# Altium footprint library ICs And Semiconductors SMD.PcbLib: 602 footprints (part 22 of 38)
Each footprint in its own frame and in the unit in brackets; x right, y up, seen from the top. Pads: shape width x height; smd on the part's side, far side on the other; paste and mask are expansions set on the pad; w line width, h text height; cw(c..) or ccw(c..) is an arc to the next point about the centre after c.
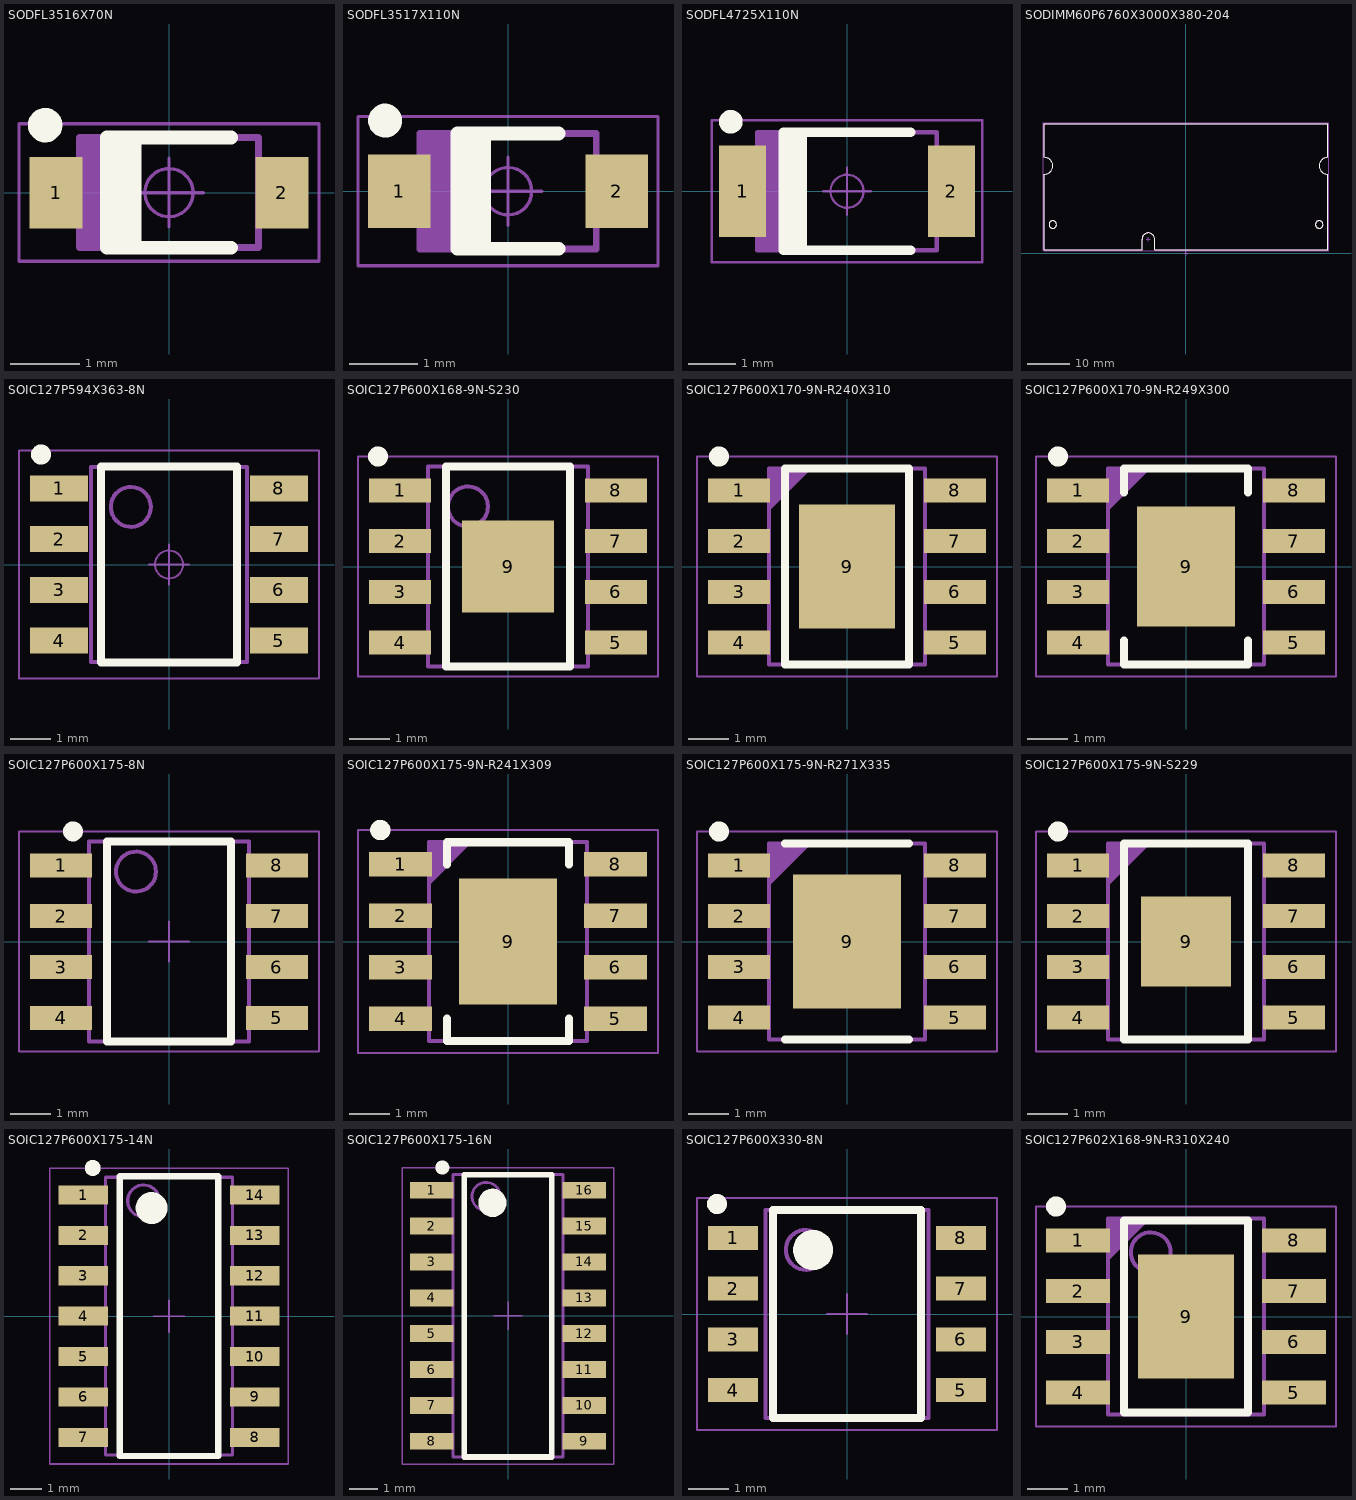
[diagram p21: the footprints below, top view; thin cyan lines are the x and y axes]

## SODFL3516X70N [mm] "SODFL Diode; 2.60mm W X 1.60mm L X 0.70mm H Body, IPC Medium Density"
height 0.7
pads (2):
  rect 0.77x1.04 smd: 1(-1.64,0) 2(1.64,0)
Top Overlay:
  circle w0.25: c-1.8,0.98 r0.125
  lines w0.2: -0.7,-0.8 -0.7,0.8 ; -0.5,-0.8 -0.5,0.8 ; 0.9,-0.8 -0.9,-0.8 -0.9,0.8 0.9,0.8
Mechanical 14:
  lines w0.1: -1.2,-0.8 -1.2,0.8 ; -1.1,-0.8 -1.1,0.8 ; -1,-0.8 -1,0.8 ; -0.9,-0.8 -0.9,0.8 ; -0.8,-0.8 -0.8,0.8 ; -0.7,-0.8 -0.7,0.8 ; -0.6,-0.8 -0.6,0.8 ; -0.5,-0.8 -0.5,0.8 ; -1.3,-0.8 1.3,-0.8 1.3,0.8 -1.3,0.8 -1.3,-0.8
Mechanical 15:
  circle w0.05: c0,0 r0.35
  lines w0.05: -0.5,0 0.5,0 ; 0,-0.5 0,0.5 ; -2.18,-1 2.18,-1 2.18,1 -2.18,1 -2.18,-1
3D body "SODFL3516X70N.stp": height 0.7, standoff 0, extent -1.7,-0.8 1.7,0.8

## SODFL3517X110N [mm] "SODFL Diode (SOD123W); 2.60mm W X 1.70mm L X 1.10mm H body, IPC Medium Density"
height 1.1
pads (2):
  rect 0.92x1.08 smd: 1(-1.6,0) 2(1.6,0)
Top Overlay:
  circle w0.25: c-1.81,1.04 r0.125
  lines w0.2: -0.55,-0.85 -0.55,0.85 ; -0.35,-0.85 -0.35,0.85 ; 0.75,-0.85 -0.75,-0.85 -0.75,0.85 0.75,0.85
Mechanical 14:
  lines w0.1: -1.2,-0.85 -1.2,0.85 ; -1.1,-0.85 -1.1,0.85 ; -1,-0.85 -1,0.85 ; -0.9,-0.85 -0.9,0.85 ; -0.8,-0.85 -0.8,0.85 ; -0.7,-0.85 -0.7,0.85 ; -0.6,-0.85 -0.6,0.85 ; -0.5,-0.85 -0.5,0.85 ; -1.3,-0.85 1.3,-0.85 1.3,0.85 -1.3,0.85 -1.3,-0.85
Mechanical 15:
  circle w0.05: c0,0 r0.35
  lines w0.05: -0.5,0 0.5,0 ; 0,-0.5 0,0.5 ; -2.21,-1.1 2.21,-1.1 2.21,1.1 -2.21,1.1 -2.21,-1.1
3D body "SODFL3517X110N.stp": height 1.1, standoff 0, extent -1.85,-0.95 1.85,0.95

## SODFL4725X110N [mm] "SOD128, SODFL Diode; 3.80mm W X 2.50mm L X 1.10mm H Body, IPC Medium Density"
height 1.1
pads (2):
  rect 1x1.93 smd: 1(-2.21,0) 2(2.21,0)
Top Overlay:
  circle w0.25: c-2.46,1.47 r0.125
  lines w0.2: -1.15,-1.25 -1.15,1.25 ; -0.95,-1.25 -0.95,1.25 ; 1.35,-1.25 -1.35,-1.25 -1.35,1.25 1.35,1.25
Mechanical 14:
  lines w0.1: -1.8,-1.25 -1.8,1.25 ; -1.7,-1.25 -1.7,1.25 ; -1.6,-1.25 -1.6,1.25 ; -1.5,-1.25 -1.5,1.25 ; -1.4,-1.25 -1.4,1.25 ; -1.3,-1.25 -1.3,1.25 ; -1.2,-1.25 -1.2,1.25 ; -1.1,-1.25 -1.1,1.25 ; -1.9,-1.25 -1.9,1.25 1.9,1.25 1.9,-1.25 -1.9,-1.25
Mechanical 15:
  circle w0.05: c0,0 r0.35
  lines w0.05: -0.5,0 0.5,0 ; 0,-0.5 0,0.5 ; -2.86,-1.5 -2.86,1.5 2.86,1.5 2.86,-1.5 -2.86,-1.5
3D body "SODFL4725X110N.stp": height 1.1, standoff 0, extent -2.5,-1.35 2.5,1.35

## SODIMM60P6760X3000X380-204 [mm] "SODIMM DDR3 204-Pin SDRAM Module, Body; 67.6mm L X 30mm W X 3.8mm H"
height 3.8
Top Overlay:
  circle w0.2: c31.8,6.8 r0.9
  circle w0.2: c-31.8,6.8 r0.9
  lines w0.2: -33.8,0.8 -33.8,18.8 ccw(c-33.8,20.8) -33.8,22.8 -33.8,30.8 33.8,30.8 33.8,22.8 ccw(c33.8,20.8) 33.8,18.8 33.8,0.8 -7.5,0.8 -7.5,3.3 ccw(c-9,3.3) -10.5,3.3 -10.5,0.8 -33.8,0.8
Mechanical 8:
  lines w0.1: -9.5,3.3 -9,3.3 ; -9,2.8 -9,3.3 ; -9,3.8 -9,3.3 ; -8.5,3.3 -9,3.3 ; -0.5,0 0,0 ; 0,-0.5 0,0 ; 0,0.5 0,0 ; 0.5,0 0,0
Mechanical 14:
  circle w0.1: c31.8,6.8 r0.9
  circle w0.1: c-31.8,6.8 r0.9
  lines w0.1: -33.8,0.8 -10.5,0.8 -10.5,3.3 cw(c-9,3.3) -7.5,3.3 -7.5,0.8 33.8,0.8 33.8,18.8 cw(c33.8,20.8) 33.8,22.8 33.8,30.8 -33.8,30.8 -33.8,22.8 cw(c-33.8,20.8) -33.8,18.8 -33.8,0.8
Mechanical 15:
  lines w0.05: -34.05,0.55 34.05,0.55 34.05,31.05 -34.05,31.05 -34.05,0.55
3D body "SODIMM60P6760X3000X380-204.stp": height 3.8, standoff 0, extent -33.8,0.8 33.8,30.8

## SOIC127P594X363-8N [mm] "SOIC, 1.27mm pitch; 8  pin, 3.91mm W X 4.88mm L, IPC Medium Density"
height 3.63
pads (8):
  rect 1.45x0.65 smd: 1(-2.75,1.905) 2(-2.75,0.635) 3(-2.75,-0.635) 4(-2.75,-1.905) 5(2.75,-1.905) 6(2.75,-0.635) 7(2.75,0.635) 8(2.75,1.905)
Top Overlay:
  circle w0.25: c-3.2,2.75 r0.125
  lines w0.2: -1.7,-2.45 -1.7,2.45 1.7,2.45 1.7,-2.45 -1.7,-2.45
Mechanical 14:
  circle w0.1: c-0.955,1.44 r0.5
  lines w0.1: -1.955,-2.44 -1.955,2.44 1.955,2.44 1.955,-2.44 -1.955,-2.44
Mechanical 15:
  circle w0.05: c0,0 r0.35
  lines w0.05: -0.5,0 0.5,0 ; 0,-0.5 0,0.5 ; -3.75,-2.85 -3.75,2.85 3.75,2.85 3.75,-2.85 -3.75,-2.85
3D body "SOIC127P594X363-8N.stp": height 3.63, standoff 0, extent -3.1,-2.5 3.1,2.5

## SOIC127P600X168-9N-S230 [mm] "SOIC, 1.27mm pitch; 8 pin, 4.00mm W X 5.00mm L X 1.68mm H body (w/thermal tab), IPC Medium Density"
height 1.68
pads (9):
  rect 1.55x0.6 smd: 1(-2.7,1.905) 2(-2.7,0.635) 3(-2.7,-0.635) 4(-2.7,-1.905) 5(2.7,-1.905) 6(2.7,-0.635) 7(2.7,0.635) 8(2.7,1.905)
  rect 2.3x2.3 smd: 9(0,0)
Top Overlay:
  circle w0.25: c-3.25,2.75 r0.125
  lines w0.2: -1.55,-2.5 1.55,-2.5 1.55,2.5 -1.55,2.5 -1.55,-2.5
Top Paste:
  region: -0.69,0.69 0.69,0.69 0.69,-0.69 -0.69,-0.69
Mechanical 14:
  circle w0.1: c-1,1.5 r0.5
  lines w0.1: -2,-2.5 2,-2.5 2,2.5 -2,2.5 -2,-2.5
Mechanical 15:
  lines w0.05: -0.5,0 0.5,0 ; 0,-0.5 0,0.5 ; -3.75,-2.75 3.75,-2.75 3.75,2.75 -3.75,2.75 -3.75,-2.75
3D body "SOIC127P600X168-9N-S230.stp": height 1.68, standoff 0, extent -3.1,-2.5 3.1,2.5

## SOIC127P600X170-9N-R240X310 [mm] "SOIC 8, Pitch 1.27mm - Body 4x5mm, (w/Thermal Tab 2.4mm X 3.1mm), IPC Medium Density"
height 1.7
pads (9):
  rect 1.55x0.6 smd: 1(-2.7,1.905) 2(-2.7,0.635) 3(-2.7,-0.635) 4(-2.7,-1.905) 5(2.7,-1.905) 6(2.7,-0.635) 7(2.7,0.635) 8(2.7,1.905)
  rect 2.4x3.1 smd: 9(0,0)
Top Overlay:
  circle w0.25: c-3.2,2.75 r0.125
  lines w0.2: -1.55,-2.45 -1.55,2.45 1.55,2.45 1.55,-2.45 -1.55,-2.45
Mechanical 14:
  lines w0.1: -1.95,1.45 -0.95,2.45 ; -1.95,1.55 -1.05,2.45 ; -1.95,1.65 -1.15,2.45 ; -1.95,1.75 -1.25,2.45 ; -1.95,1.85 -1.35,2.45 ; -1.95,1.95 -1.45,2.45 ; -1.95,2.05 -1.55,2.45 ; -1.95,2.15 -1.65,2.45 ; -1.95,2.25 -1.75,2.45 ; -1.95,2.35 -1.85,2.45 ; -1.95,-2.45 -1.95,2.45 1.95,2.45 1.95,-2.45 -1.95,-2.45
Mechanical 15:
  circle w0.05: c0,0 r0.35
  lines w0.05: -0.5,0 0.5,0 ; 0,-0.5 0,0.5 ; -3.75,-2.75 -3.75,2.75 3.75,2.75 3.75,-2.75 -3.75,-2.75
3D body "SOIC127P600X170-9N-R240X310.stp": height 1.75, standoff 0, extent -3.1,-2.5 3.1,2.5

## SOIC127P600X170-9N-R249X300 [mm] "SOIC 8, Pitch 1.27mm - Body 4x5mm, (w/thermal tab 2.49mm X 3mm), IPC Medium Density"
height 1.7
pads (9):
  rect 1.55x0.6 smd: 1(-2.7,1.905) 2(-2.7,0.635) 3(-2.7,-0.635) 4(-2.7,-1.905) 5(2.7,-1.905) 6(2.7,-0.635) 7(2.7,0.635) 8(2.7,1.905)
  rect 2.45x3 smd: 9(0,0)
Top Overlay:
  circle w0.25: c-3.2,2.75 r0.125
  lines w0.2: -1.55,-1.85 -1.55,-2.45 1.55,-2.45 1.55,-1.85 ; -1.55,1.85 -1.55,2.45 1.55,2.45 1.55,1.85
Mechanical 14:
  lines w0.1: -1.95,1.45 -0.95,2.45 ; -1.95,1.55 -1.05,2.45 ; -1.95,1.65 -1.15,2.45 ; -1.95,1.75 -1.25,2.45 ; -1.95,1.85 -1.35,2.45 ; -1.95,1.95 -1.45,2.45 ; -1.95,2.05 -1.55,2.45 ; -1.95,2.15 -1.65,2.45 ; -1.95,2.25 -1.75,2.45 ; -1.95,2.35 -1.85,2.45 ; -1.95,-2.45 1.95,-2.45 1.95,2.45 -1.95,2.45 -1.95,-2.45
Mechanical 15:
  circle w0.05: c0,0 r0.35
  lines w0.05: -0.5,0 0.5,0 ; 0,-0.5 0,0.5 ; -3.75,-2.75 3.75,-2.75 3.75,2.75 -3.75,2.75 -3.75,-2.75
3D body "SOIC127P600X170-9N-R249X300.stp": height 1.75, standoff 0, extent -3.1,-2.5 3.1,2.5

## SOIC127P600X175-8N [mm] "SOIC 8, Pitch 1.27mm - Body 4x5mm, IPC Medium Density"
height 1.75
pads (8):
  rect 1.55x0.6 smd: 1(-2.7,1.905) 2(-2.7,0.635) 3(-2.7,-0.635) 4(-2.7,-1.905) 5(2.7,-1.905) 6(2.7,-0.635) 7(2.7,0.635) 8(2.7,1.905)
Top Overlay:
  circle w0.25: c-2.4,2.755 r0.125
  lines w0.2: -1.55,-2.5 1.55,-2.5 1.55,2.5 -1.55,2.5 -1.55,-2.5
Mechanical 14:
  circle w0.1: c-0.825,1.75 r0.5
  lines w0.1: -2,-2.5 2,-2.5 2,2.5 -2,2.5 -2,-2.5
Mechanical 15:
  lines w0.05: -0.5,0 0.5,0 ; 0,-0.5 0,0.5 ; -3.75,-2.75 3.75,-2.75 3.75,2.75 -3.75,2.75 -3.75,-2.75
3D body "SOIC127P600X175-8N.stp": height 1.75, standoff 0, extent -3.1,-2.5 3.1,2.5

## SOIC127P600X175-9N-R241X309 [mm] "SOIC 8, Pitch 1.27mm - Body 3.9x4.9mm, (w/thermal tab 2.41mm X 3.098mm), IPC Medium Density"
height 1.75
pads (9):
  rect 1.55x0.6 smd: 1(-2.65,1.905) 2(-2.65,0.635) 3(-2.65,-0.635) 4(-2.65,-1.905) 5(2.65,-1.905) 6(2.65,-0.635) 7(2.65,0.635) 8(2.65,1.905)
  rect 2.41x3.098 smd: 9(0,0)
Top Overlay:
  circle w0.25: c-3.15,2.75 r0.125
  lines w0.2: -1.5,-1.9 -1.5,-2.45 1.5,-2.45 1.5,-1.9 ; -1.5,1.9 -1.5,2.45 1.5,2.45 1.5,1.9
Mechanical 14:
  lines w0.1: -1.95,1.45 -0.95,2.45 ; -1.95,1.55 -1.05,2.45 ; -1.95,1.65 -1.15,2.45 ; -1.95,1.75 -1.25,2.45 ; -1.95,1.85 -1.35,2.45 ; -1.95,1.95 -1.45,2.45 ; -1.95,2.05 -1.55,2.45 ; -1.95,2.15 -1.65,2.45 ; -1.95,2.25 -1.75,2.45 ; -1.95,2.35 -1.85,2.45 ; -1.95,-2.45 1.95,-2.45 1.95,2.45 -1.95,2.45 -1.95,-2.45
Mechanical 15:
  circle w0.05: c0,0 r0.35
  lines w0.05: -0.5,0 0.5,0 ; 0,-0.5 0,0.5 ; -3.7,-2.75 3.7,-2.75 3.7,2.75 -3.7,2.75 -3.7,-2.75
3D body "SOIC127P600X175-9N-R241X309.stp": height 1.75, standoff 0, extent -3.1,-2.5 3.1,2.5

## SOIC127P600X175-9N-R271X335 [mm] "SOIC, 1.27mm Pitch; 8 Pin, 3.90mm W X 4.90mm L X 1.75mm H body, (w/thermal tab 2.71mm X 3.35mm), IPC Medium Density"
height 1.75
pads (9):
  rect 1.55x0.6 smd: 1(-2.7,1.905) 2(-2.7,0.635) 3(-2.7,-0.635) 4(-2.7,-1.905) 5(2.7,-1.905) 6(2.7,-0.635) 7(2.7,0.635) 8(2.7,1.905)
  rect 2.7x3.35 smd: 9(0,0)
Top Overlay:
  circle w0.25: c-3.2,2.75 r0.125
  lines w0.2: -1.55,-2.45 1.55,-2.45 ; -1.55,2.45 1.55,2.45
Mechanical 14:
  lines w0.1: -1.95,1.45 -0.95,2.45 ; -1.95,1.55 -1.05,2.45 ; -1.95,1.65 -1.15,2.45 ; -1.95,1.75 -1.25,2.45 ; -1.95,1.85 -1.35,2.45 ; -1.95,1.95 -1.45,2.45 ; -1.95,2.05 -1.55,2.45 ; -1.95,2.15 -1.65,2.45 ; -1.95,2.25 -1.75,2.45 ; -1.95,2.35 -1.85,2.45 ; -1.95,-2.45 -1.95,2.45 1.95,2.45 1.95,-2.45 -1.95,-2.45
Mechanical 15:
  circle w0.05: c0,0 r0.35
  lines w0.05: -0.5,0 0.5,0 ; 0,-0.5 0,0.5 ; -3.75,-2.75 -3.75,2.75 3.75,2.75 3.75,-2.75 -3.75,-2.75
3D body "SOIC127P600X175-9N-R271X335.stp": height 1.75, standoff 0, extent -3.1,-2.5 3.1,2.5

## SOIC127P600X175-9N-S229 [mm] "SOIC 8, Pitch 1.27mm - Body 4x5mm, (w/thermal tab 2.29mm X 2.29mm), IPC Medium Density"
height 1.75
pads (9):
  rect 1.55x0.6 smd: 1(-2.7,1.905) 2(-2.7,0.635) 3(-2.7,-0.635) 4(-2.7,-1.905) 5(2.7,-1.905) 6(2.7,-0.635) 7(2.7,0.635) 8(2.7,1.905)
  rect 2.25x2.25 smd: 9(0,0)
Top Overlay:
  circle w0.25: c-3.2,2.75 r0.125
  lines w0.2: -1.55,-2.45 1.55,-2.45 1.55,2.45 -1.55,2.45 -1.55,-2.45
Mechanical 14:
  lines w0.1: -1.95,1.45 -0.95,2.45 ; -1.95,1.55 -1.05,2.45 ; -1.95,1.65 -1.15,2.45 ; -1.95,1.75 -1.25,2.45 ; -1.95,1.85 -1.35,2.45 ; -1.95,1.95 -1.45,2.45 ; -1.95,2.05 -1.55,2.45 ; -1.95,2.15 -1.65,2.45 ; -1.95,2.25 -1.75,2.45 ; -1.95,2.35 -1.85,2.45 ; -1.95,-2.45 1.95,-2.45 1.95,2.45 -1.95,2.45 -1.95,-2.45
Mechanical 15:
  lines w0.05: -0.5,0 0.5,0 ; 0,-0.5 0,0.5 ; -3.75,-2.75 3.75,-2.75 3.75,2.75 -3.75,2.75 -3.75,-2.75
3D body "SOIC127P600X175-9N-S229.stp": height 1.75, standoff 0, extent -3.1,-2.5 3.1,2.5

## SOIC127P600X175-14N [mm] "SOIC 14, Pitch 1.27mm - Body 4x8.75mm, IPC Medium Density"
height 1.75
pads (14):
  rect 1.55x0.6 smd: 1(-2.7,3.81) 2(-2.7,2.54) 3(-2.7,1.27) 4(-2.7,0) 5(-2.7,-1.27) 6(-2.7,-2.54) 7(-2.7,-3.81) 8(2.7,-3.81) 9(2.7,-2.54) 10(2.7,-1.27) 11(2.7,0) 12(2.7,1.27) 13(2.7,2.54) 14(2.7,3.81)
Top Overlay:
  circle w0.25: c-2.4,4.66 r0.125
  circle w0.5: c-0.55,3.4 r0.25
  lines w0.2: -1.55,-4.4 1.55,-4.4 1.55,4.4 -1.55,4.4 -1.55,-4.4
Mechanical 14:
  circle w0.1: c-0.8,3.625 r0.5
  lines w0.1: -2,-4.37 2,-4.37 2,4.37 -2,4.37 -2,-4.37
Mechanical 15:
  lines w0.05: -0.5,0 0.5,0 ; 0,-0.5 0,0.5 ; -3.75,-4.65 3.75,-4.65 3.75,4.65 -3.75,4.65 -3.75,-4.65
3D body "SOIC127P600X175-14N.stp": height 1.75, standoff 0, extent -3.1,-4.375 3.1,4.375

## SOIC127P600X175-16N [mm] "SOIC 16, Pitch 1.27mm - Body 4x10mm, IPC Medium Density"
height 1.75
pads (16):
  rect 1.55x0.6 smd: 1(-2.7,4.445) 2(-2.7,3.175) 3(-2.7,1.905) 4(-2.7,0.635) 5(-2.7,-0.635) 6(-2.7,-1.905) 7(-2.7,-3.175) 8(-2.7,-4.445) 9(2.7,-4.445) 10(2.7,-3.175) 11(2.7,-1.905) 12(2.7,-0.635) 13(2.7,0.635) 14(2.7,1.905) 15(2.7,3.175) 16(2.7,4.445)
Top Overlay:
  circle w0.25: c-2.325,5.25 r0.125
  circle w0.5: c-0.55,4 r0.25
  lines w0.2: -1.55,-5 -1.55,5 1.55,5 1.55,-5 -1.55,-5
Mechanical 14:
  circle w0.1: c-0.775,4.225 r0.5
  lines w0.1: -1.95,-5 1.95,-5 1.95,5 -1.95,5 -1.95,-5
Mechanical 15:
  lines w0.05: -0.5,0 0.5,0 ; 0,-0.5 0,0.5 ; -3.75,-5.25 -3.75,5.25 3.75,5.25 3.75,-5.25 -3.75,-5.25
3D body "SOIC127P600X175-16N.stp": height 1.75, standoff 0, extent -3.1,-5 3.1,5

## SOIC127P600X330-8N [mm] "SOIC, 1.27mm pitch;8  pin, 4.00mm W X 5.00mm L, IPC Medium Density"
height 3.3
pads (8):
  rect 1.25x0.6 smd: 1(-2.85,1.905) 2(-2.85,0.635) 3(-2.85,-0.635) 4(-2.85,-1.905) 5(2.85,-1.905) 6(2.85,-0.635) 7(2.85,0.635) 8(2.85,1.905)
Top Overlay:
  circle w0.5: c-0.85,1.6 r0.25
  circle w0.25: c-3.25,2.75 r0.125
  lines w0.2: -1.85,-2.6 1.85,-2.6 1.85,2.6 -1.85,2.6 -1.85,-2.6
Mechanical 14:
  circle w0.1: c-1.032,1.604 r0.5
  lines w0.1: -2.032,-2.604 2.032,-2.604 2.032,2.604 -2.032,2.604 -2.032,-2.604
Mechanical 15:
  lines w0.05: -0.5,0 0.5,0 ; 0,-0.5 0,0.5 ; -3.75,-2.9 3.75,-2.9 3.75,2.9 -3.75,2.9 -3.75,-2.9
3D body "SOIC127P600X330-8N.stp": height 3.3, standoff 0, extent -3,-2.6 3,2.6

## SOIC127P602X168-9N-R310X240 [mm] "SOIC,1.27mm,pitch;8 pin,3.905mm W X 4.895mm L X 1.68mm H body (w/thermal tab 3.1mm X 2.4mm), IPC Medium Density"
height 1.68
pads (9):
  rect 1.6x0.6 smd: 1(-2.7,1.905) 2(-2.7,0.635) 3(-2.7,-0.635) 4(-2.7,-1.905) 5(2.7,-1.905) 6(2.7,-0.635) 7(2.7,0.635) 8(2.7,1.905)
  rect 2.4x3.1 smd: 9(0,0)
Top Overlay:
  circle w0.25: c-3.25,2.75 r0.125
  lines w0.2: -1.55,-2.4 1.55,-2.4 1.55,2.4 -1.55,2.4 -1.55,-2.4
Mechanical 14:
  circle w0.1: c-0.882,1.604 r0.5
  lines w0.1: -1.953,1.447 -0.952,2.448 ; -1.953,1.547 -1.052,2.448 ; -1.953,1.647 -1.152,2.448 ; -1.953,1.847 -1.352,2.448 ; -1.953,2.047 -1.552,2.448 ; -1.953,2.148 -1.652,2.448 ; -1.953,2.347 -1.852,2.448 ; -1.952,1.747 -1.252,2.448 ; -1.952,1.947 -1.452,2.448 ; -1.952,2.247 -1.752,2.448 ; -1.952,-2.448 1.952,-2.448 1.952,2.448 -1.952,2.448 -1.952,-2.448
Mechanical 15:
  lines w0.05: -0.5,0 0.5,0 ; 0,-0.5 0,0.5 ; -3.75,-2.75 3.75,-2.75 3.75,2.75 -3.75,2.75 -3.75,-2.75
3D body "SOIC127P602X168-9N-R310X240.stp": height 1.68, standoff 0, extent -3.1,-2.5 3.1,2.5